# Altium footprint library PcbLibLafe.PcbLib: 297 footprints (part 9 of 19)
Each footprint in its own frame and in the unit in brackets; x right, y up, seen from the top. Pads: shape width x height; smd on the part's side, far side on the other; paste and mask are expansions set on the pad; w line width, h text height; cw(c..) or ccw(c..) is an arc to the next point about the centre after c.
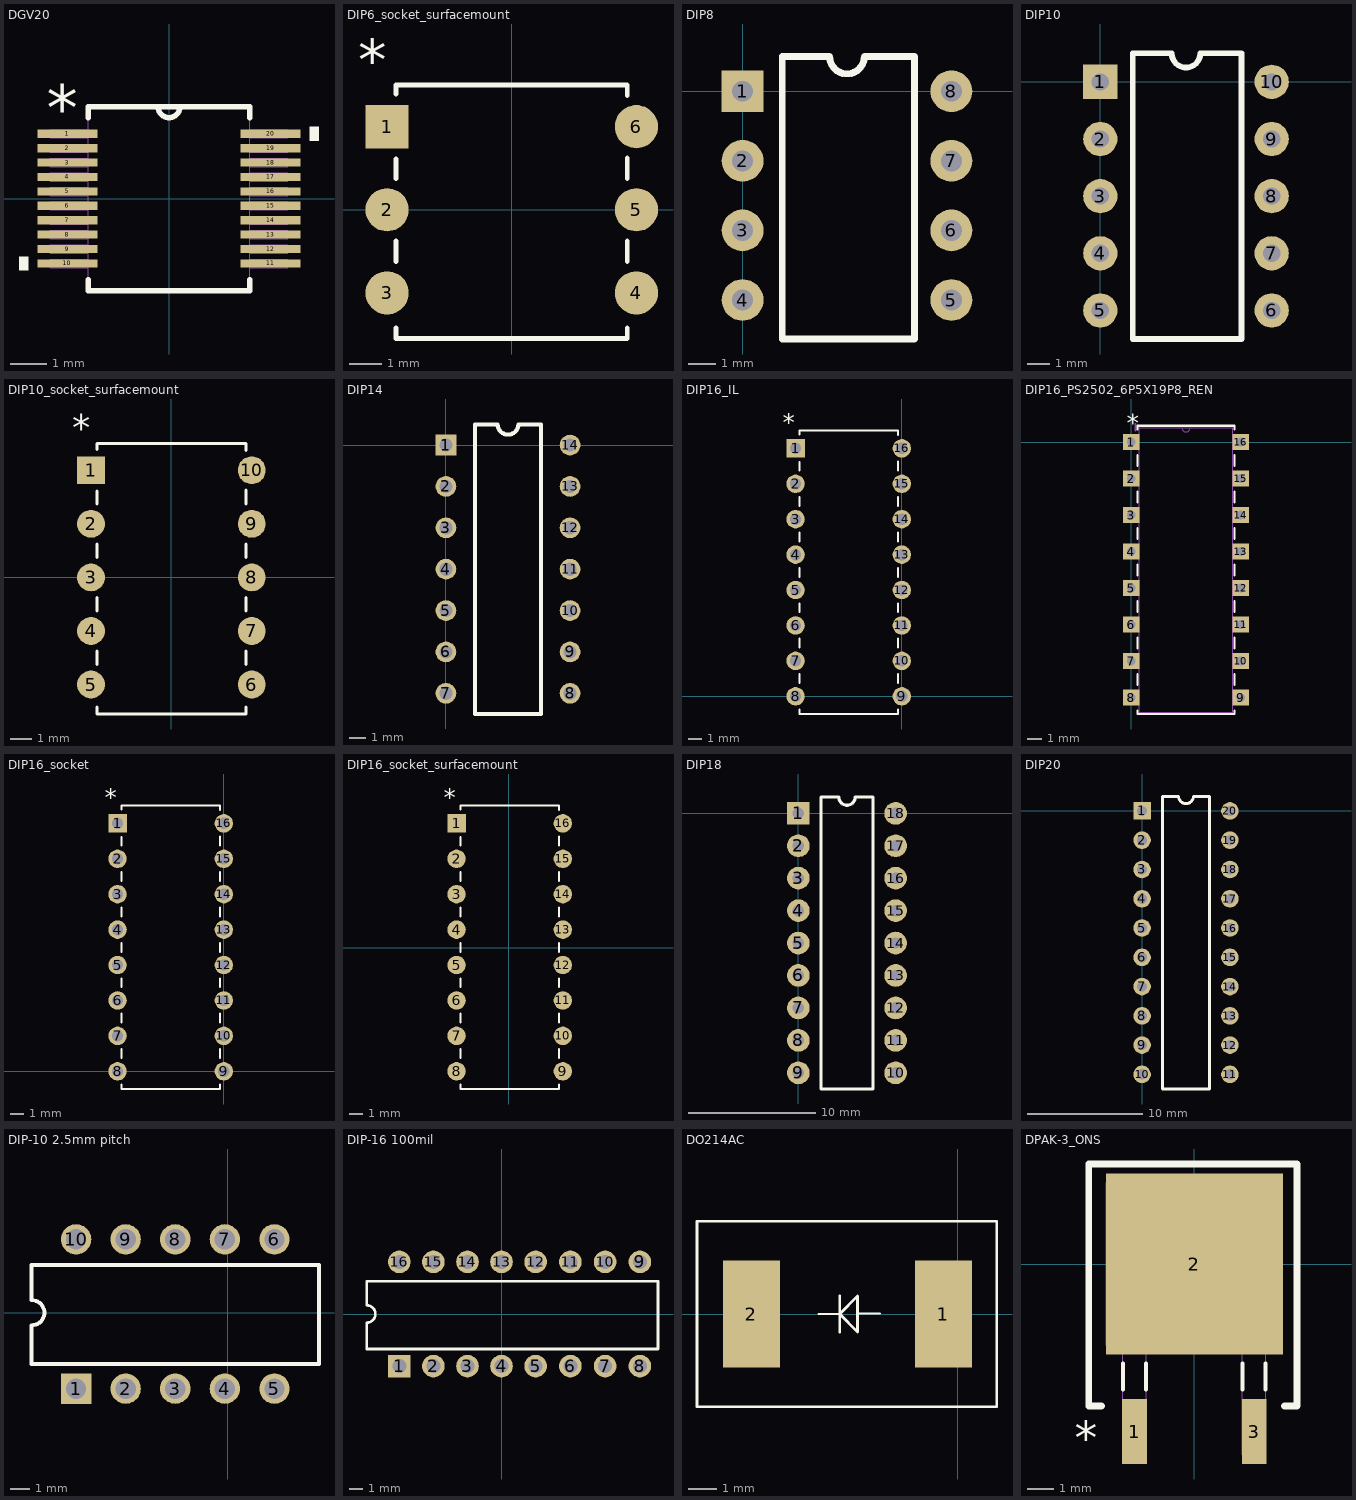
[diagram p8: the footprints below, top view; thin cyan lines are the x and y axes]

## DGV20 [mil]
pads (20):
  rect 66x9 smd: 1(-111,70.87) 2(-111,55.12) 3(-111,39.37) 4(-111,23.62) 5(-111,7.87) 6(-111,-7.87) 7(-111,-23.62) 8(-111,-39.37) 9(-111,-55.12) 10(-111,-70.87) 11(111,-70.87) 12(111,-55.12) 13(111,-39.37) 14(111,-23.62) 15(111,-7.87) 16(111,7.87) 17(111,23.62) 18(111,39.37) 19(111,55.12) 20(111,70.87)
Top Overlay:
  region: -154,-63.37 -164,-63.37 -164,-78.37 -154,-78.37
  region: 154,78.37 164,78.37 164,63.37 154,63.37
  lines w6: -88.5,-88.47 -88.5,-100.5 88.5,-100.5 88.5,-88.47 ; -88.5,88.47 -88.5,100.5 88.5,100.5 88.5,88.47 ; -12,100.5 ccw(c0,100.5) 12,100.5
  text "*" at -133.5,74.87 h50
Mechanical 13:
  lines w0: -12,100.5 ccw(c0,100.5) 12,100.5
  lines w1: -130,-75.37 -130,-66.37 -88.5,-66.37 -88.5,-75.37 -130,-75.37 ; -130,-59.62 -130,-50.62 -88.5,-50.62 -88.5,-59.62 -130,-59.62 ; -130,-43.87 -130,-34.87 -88.5,-34.87 -88.5,-43.87 -130,-43.87 ; -130,-28.12 -130,-19.12 -88.5,-19.12 -88.5,-28.12 -130,-28.12 ; -130,-12.37 -130,-3.37 -88.5,-3.37 -88.5,-12.37 -130,-12.37 ; -130,3.37 -130,12.37 -88.5,12.37 -88.5,3.37 -130,3.37 ; -130,19.12 -130,28.12 -88.5,28.12 -88.5,19.12 -130,19.12 ; -130,34.87 -130,43.87 -88.5,43.87 -88.5,34.87 -130,34.87 ; -130,50.62 -130,59.62 -88.5,59.62 -88.5,50.62 -130,50.62 ; -130,66.37 -130,75.37 -88.5,75.37 -88.5,66.37 -130,66.37 ; -88.5,-100.5 88.5,-100.5 88.5,100.5 -88.5,100.5 -88.5,-100.5 ; 88.5,-75.37 88.5,-66.37 130,-66.37 130,-75.37 88.5,-75.37 ; 88.5,-59.62 88.5,-50.62 130,-50.62 130,-59.62 88.5,-59.62 ; 88.5,-43.87 88.5,-34.87 130,-34.87 130,-43.87 88.5,-43.87 ; 88.5,-28.12 88.5,-19.12 130,-19.12 130,-28.12 88.5,-28.12 ; 88.5,-12.37 88.5,-3.37 130,-3.37 130,-12.37 88.5,-12.37 ; 88.5,3.37 88.5,12.37 130,12.37 130,3.37 88.5,3.37 ; 88.5,19.12 88.5,28.12 130,28.12 130,19.12 88.5,19.12 ; 88.5,34.87 88.5,43.87 130,43.87 130,34.87 88.5,34.87 ; 88.5,50.62 88.5,59.62 130,59.62 130,50.62 88.5,50.62 ; 88.5,66.37 88.5,75.37 130,75.37 130,66.37 88.5,66.37
  text "*" at -133.5,74.87 h50
3D body: height 10, standoff 0, extent 0,0 10,10
3D body "DGV0020A.stp": height 44.49, standoff 0, extent -125.98,-98.42 125.99,98.43

## DIP6_socket_surfacemount [mil]
pads (6):
  rect 52x52 smd mask+10: 1(-150,100)
  round 52 smd mask+10: 2(-150,0) 3(-150,-100) 4(150,-100) 5(150,0) 6(150,100)
Top Overlay:
  lines w6: -139,-142.52 -139,-155 139,-155 139,-142.52 ; -139,-62.48 -139,-37.52 ; -139,37.52 -139,60.9 ; -139,139.1 -139,150 139,150 139,137.52 ; 139,-62.48 139,-37.52 ; 139,37.52 139,62.48
  text "*" at -185,155 h50
Mechanical 13:
  lines w1: -166,-116 -134,-116 -134,-84 -166,-84 -166,-116 ; -166,-16 -134,-16 -134,16 -166,16 -166,-16 ; -166,84 -134,84 -134,116 -166,116 -166,84 ; 134,-116 166,-116 166,-84 134,-84 134,-116 ; 134,-16 166,-16 166,16 134,16 134,-16 ; 134,84 166,84 166,116 134,116 134,84

## DIP8 [mil]
pads (8):
  rect 60x60 hole 30: 1(0,0)
  round 60 hole 30: 2(0,-100) 3(0,-200) 4(0,-300) 5(300,-300) 6(300,-200) 7(300,-100) 8(300,0)
Top Overlay:
  lines w10: 57,-356 247,-356 247,50 175,50 cw(c150,50) 125,50 57,50 57,-356
3D body "210-xx-308-41-001000.SLDPRT": height 109.84, standoff -180.31, extent -48.82,-347.64 348.82,50

## DIP10 [mil]
pads (10):
  rect 60x60 hole 30: 1(0,0)
  round 60 hole 30: 2(0,-100) 3(0,-200) 4(0,-300) 5(0,-400) 6(300,-400) 7(300,-300) 8(300,-200) 9(300,-100) 10(300,0)
Top Overlay:
  lines w10: 57,-450 247,-450 247,50 175,50 cw(c150,50) 125,50 57,50 57,-450

## DIP10_socket_surfacemount [mil]
pads (10):
  rect 52x52 smd mask+10: 1(-150,200)
  round 52 smd mask+10: 2(-150,100) 3(-150,0) 4(-150,-100) 5(-150,-200) 6(150,-200) 7(150,-100) 8(150,0) 9(150,100) 10(150,200)
Top Overlay:
  lines w6: -139,-242.52 -139,-255 139,-255 139,-242.52 ; -139,-162.48 -139,-137.52 ; -139,-62.48 -139,-37.52 ; -139,37.52 -139,62.48 ; -139,137.52 -139,160.9 ; -139,239.1 -139,250 139,250 139,237.52 ; 139,-162.48 139,-137.52 ; 139,-62.48 139,-37.52 ; 139,37.52 139,62.48 ; 139,137.52 139,162.48
  text "*" at -185,255 h50
Mechanical 13:
  lines w1: -166,-216 -134,-216 -134,-184 -166,-184 -166,-216 ; -166,-116 -134,-116 -134,-84 -166,-84 -166,-116 ; -166,-16 -134,-16 -134,16 -166,16 -166,-16 ; -166,84 -134,84 -134,116 -166,116 -166,84 ; -166,184 -134,184 -134,216 -166,216 -166,184 ; 134,-216 166,-216 166,-184 134,-184 134,-216 ; 134,-116 166,-116 166,-84 134,-84 134,-116 ; 134,-16 166,-16 166,16 134,16 134,-16 ; 134,84 166,84 166,116 134,116 134,84 ; 134,184 166,184 166,216 134,216 134,184

## DIP14 [mil]
pads (14):
  rect 50x50 hole 32: 1(0,0)
  round 50 hole 32: 2(0,-100) 3(0,-200) 4(0,-300) 5(0,-400) 6(0,-500) 7(0,-600) 8(300,-600) 9(300,-500) 10(300,-400) 11(300,-300) 12(300,-200) 13(300,-100) 14(300,0)
Top Overlay:
  lines w10: 70,-650 230,-650 230,50 175,50 cw(c150,50) 125,50 70,50 70,-650
3D body "4114r.stp": height 172.44, standoff -142.52, extent -20.47,-686.02 319.69,78.94

## DIP16_IL [mil]
pads (16):
  rect 52x52 hole 32: 1(-300,700)
  round 52 hole 32: 2(-300,600) 3(-300,500) 4(-300,400) 5(-300,300) 6(-300,200) 7(-300,100) 8(-300,0) 9(0,0) 10(0,100) 11(0,200) 12(0,300) 13(0,400) 14(0,500) 15(0,600) 16(0,700)
Top Overlay:
  lines w6: -289,-37.52 -289,-50 -11,-50 -11,-37.52 ; -289,37.52 -289,62.48 ; -289,137.52 -289,162.48 ; -289,237.52 -289,262.48 ; -289,337.52 -289,362.48 ; -289,437.52 -289,462.48 ; -289,537.52 -289,562.48 ; -289,637.52 -289,660.9 ; -289,739.1 -289,750 -11,750 -11,737.52 ; -11,37.52 -11,62.48 ; -11,137.52 -11,162.48 ; -11,237.52 -11,262.48 ; -11,337.52 -11,362.48 ; -11,437.52 -11,462.48 ; -11,537.52 -11,562.48 ; -11,637.52 -11,662.48
  text "*" at -335.63,747.05 h50
Mechanical 13:
  lines w1: -316,-16 -284,-16 -284,16 -316,16 -316,-16 ; -316,84 -284,84 -284,116 -316,116 -316,84 ; -316,184 -284,184 -284,216 -316,216 -316,184 ; -316,284 -284,284 -284,316 -316,316 -316,284 ; -316,384 -284,384 -284,416 -316,416 -316,384 ; -316,484 -284,484 -284,516 -316,516 -316,484 ; -316,584 -284,584 -284,616 -316,616 -316,584 ; -316,684 -284,684 -284,716 -316,716 -316,684 ; -16,-16 16,-16 16,16 -16,16 -16,-16 ; -16,84 16,84 16,116 -16,116 -16,84 ; -16,184 16,184 16,216 -16,216 -16,184 ; -16,284 16,284 16,316 -16,316 -16,284 ; -16,384 16,384 16,416 -16,416 -16,384 ; -16,484 16,484 16,516 -16,516 -16,484 ; -16,584 16,584 16,616 -16,616 -16,584 ; -16,684 16,684 16,716 -16,716 -16,684
3D body "DIP16_IL.step": height 190.12, standoff -100, extent -306.65,-42.95 13.34,747.05
3D body: height 10, standoff 0, extent 0,0 10,10

## DIP16_PS2502_6P5X19P8_REN [mil]
pads (16):
  rect 44x44 hole 24 mask+0: 1(0,0) 2(0,-100) 3(0,-200) 4(0,-300) 5(0,-400) 6(0,-500) 7(0,-600) 8(0,-700) 9(300,-700) 10(300,-600) 11(300,-500) 12(300,-400) 13(300,-300) 14(300,-200) 15(300,-100) 16(300,0)
Top Overlay:
  lines w6: 17,-735.1 17,-745 283,-745 283,-735.1 ; 17,-664.9 17,-635.1 ; 17,-564.9 17,-535.1 ; 17,-464.9 17,-435.1 ; 17,-364.9 17,-335.1 ; 17,-264.9 17,-235.1 ; 17,-164.9 17,-135.1 ; 17,-64.9 17,-35.1 ; 17,35.1 17,45 283,45 283,35.1 ; 283,-664.9 283,-635.1 ; 283,-564.9 283,-535.1 ; 283,-464.9 283,-435.1 ; 283,-364.9 283,-335.1 ; 283,-264.9 283,-235.1 ; 283,-164.9 283,-135.1 ; 283,-64.9 283,-35.1
  text "*" at -12.5,27 h50
Mechanical 13:
  lines w0: 138,40 ccw(c150,40) 162,40
  lines w1: -12,-712 -12,-688 22,-688 22,-712 -12,-712 ; -12,-612 -12,-588 22,-588 22,-612 -12,-612 ; -12,-512 -12,-488 22,-488 22,-512 -12,-512 ; -12,-412 -12,-388 22,-388 22,-412 -12,-412 ; -12,-312 -12,-288 22,-288 22,-312 -12,-312 ; -12,-212 -12,-188 22,-188 22,-212 -12,-212 ; -12,-112 -12,-88 22,-88 22,-112 -12,-112 ; -12,-12 -12,12 22,12 22,-12 -12,-12 ; 22,-740 278,-740 278,40 22,40 22,-740 ; 278,-712 278,-688 312,-688 312,-712 278,-712 ; 278,-612 278,-588 312,-588 312,-612 278,-612 ; 278,-512 278,-488 312,-488 312,-512 278,-512 ; 278,-412 278,-388 312,-388 312,-412 278,-412 ; 278,-312 278,-288 312,-288 312,-312 278,-312 ; 278,-212 278,-188 312,-188 312,-212 278,-212 ; 278,-112 278,-88 312,-88 312,-112 278,-112 ; 278,-12 278,12 312,12 312,-12 278,-12
  text "*" at 19.5,-25 h50
Mechanical 15:
  lines w6: 12,32 12,50
3D body "DIP16_PS2502_6P5X19P8_REN.step": height 184.09, standoff -100, extent -16.8,-738.02 303.19,41.98
3D body: height 10, standoff 0, extent 0,0 10,10

## DIP16_socket [mil]
pads (16):
  rect 52x52 hole 32: 1(-300,700)
  round 52 hole 32: 2(-300,600) 3(-300,500) 4(-300,400) 5(-300,300) 6(-300,200) 7(-300,100) 8(-300,0) 9(0,0) 10(0,100) 11(0,200) 12(0,300) 13(0,400) 14(0,500) 15(0,600) 16(0,700)
Top Overlay:
  lines w6: -289,-37.52 -289,-50 -11,-50 -11,-37.52 ; -289,37.52 -289,62.48 ; -289,137.52 -289,162.48 ; -289,237.52 -289,262.48 ; -289,337.52 -289,362.48 ; -289,437.52 -289,462.48 ; -289,537.52 -289,562.48 ; -289,637.52 -289,660.9 ; -289,739.1 -289,750 -11,750 -11,737.52 ; -11,37.52 -11,62.48 ; -11,137.52 -11,162.48 ; -11,237.52 -11,262.48 ; -11,337.52 -11,362.48 ; -11,437.52 -11,462.48 ; -11,537.52 -11,562.48 ; -11,637.52 -11,662.48
  text "*" at -335.63,747.05 h50
Mechanical 13:
  lines w1: -316,-16 -316,16 -284,16 -284,-16 -316,-16 ; -316,84 -316,116 -284,116 -284,84 -316,84 ; -316,184 -316,216 -284,216 -284,184 -316,184 ; -316,284 -316,316 -284,316 -284,284 -316,284 ; -316,384 -316,416 -284,416 -284,384 -316,384 ; -316,484 -316,516 -284,516 -284,484 -316,484 ; -316,584 -316,616 -284,616 -284,584 -316,584 ; -316,684 -316,716 -284,716 -284,684 -316,684 ; -16,-16 -16,16 16,16 16,-16 -16,-16 ; -16,84 -16,116 16,116 16,84 -16,84 ; -16,184 -16,216 16,216 16,184 -16,184 ; -16,284 -16,316 16,316 16,284 -16,284 ; -16,384 -16,416 16,416 16,384 -16,384 ; -16,484 -16,516 16,516 16,484 -16,484 ; -16,584 -16,616 16,616 16,584 -16,584 ; -16,684 -16,716 16,716 16,684 -16,684
3D body: height 10, standoff 0, extent 0,0 10,10
3D body "socket_ar_16-hzl-tt.stp": height 118.15, standoff -174.41, extent -349.99,-50.01 50.01,749.99

## DIP16_socket_surfacemount [mil]
pads (16):
  rect 52x52 smd mask+10: 1(-147,351)
  round 52 smd mask+10: 2(-147,251) 3(-147,151) 4(-147,51) 5(-147,-49) 6(-147,-149) 7(-147,-249) 8(-147,-349) 9(153,-349) 10(153,-249) 11(153,-149) 12(153,-49) 13(153,51) 14(153,151) 15(153,251) 16(153,351)
Top Overlay:
  lines w6: -136,-386.53 -136,-399 142,-399 142,-386.53 ; -136,-311.48 -136,-286.53 ; -136,-211.48 -136,-186.53 ; -136,-111.48 -136,-86.53 ; -136,-11.48 -136,13.47 ; -136,88.52 -136,113.47 ; -136,188.52 -136,213.47 ; -136,288.52 -136,311.9 ; -136,390.1 -136,401 142,401 142,388.52 ; 142,-311.48 142,-286.53 ; 142,-211.48 142,-186.53 ; 142,-111.48 142,-86.53 ; 142,-11.48 142,13.47 ; 142,88.52 142,113.47 ; 142,188.52 142,213.47 ; 142,288.52 142,313.47
  text "*" at -182.63,398.04 h50
Mechanical 13:
  lines w1: -163,-365 -131,-365 -131,-333 -163,-333 -163,-365 ; -163,-265 -131,-265 -131,-233 -163,-233 -163,-265 ; -163,-165 -131,-165 -131,-133 -163,-133 -163,-165 ; -163,-65 -131,-65 -131,-33 -163,-33 -163,-65 ; -163,35 -131,35 -131,67 -163,67 -163,35 ; -163,135 -131,135 -131,167 -163,167 -163,135 ; -163,235 -131,235 -131,267 -163,267 -163,235 ; -163,335 -131,335 -131,367 -163,367 -163,335 ; 137,-365 169,-365 169,-333 137,-333 137,-365 ; 137,-265 169,-265 169,-233 137,-233 137,-265 ; 137,-165 169,-165 169,-133 137,-133 137,-165 ; 137,-65 169,-65 169,-33 137,-33 137,-65 ; 137,35 169,35 169,67 137,67 137,35 ; 137,135 169,135 169,167 137,167 137,135 ; 137,235 169,235 169,267 137,267 137,235 ; 137,335 169,335 169,367 137,367 137,335
3D body: height 10, standoff 0, extent 153,-349 163,-339
3D body "socket_ar_16-hzl-tt.stp": height 120.15, standoff -172.41, extent -200,-400 200,400

## DIP18 [mil]
pads (18):
  rect 70x70 hole 35: 1(0,0)
  round 70 hole 35: 2(0,-100) 3(0,-200) 4(0,-300) 5(0,-400) 6(0,-500) 7(0,-600) 8(0,-700) 9(0,-800) 10(300,-800) 11(300,-700) 12(300,-600) 13(300,-500) 14(300,-400) 15(300,-300) 16(300,-200) 17(300,-100) 18(300,0)
Top Overlay:
  lines w10: 70,-850 70,50 125,50 ccw(c150,50) 175,50 230,50 230,-850 70,-850
3D body "DIP-18_STM.step": height 206.1, standoff -100, extent -5.97,-868.3 314.02,107.69

## DIP20 [mil]
pads (20):
  rect 60x60 hole 35: 1(0,0)
  round 60 hole 35: 2(0,-100) 3(0,-200) 4(0,-300) 5(0,-400) 6(0,-500) 7(0,-600) 8(0,-700) 9(0,-800) 10(0,-900) 11(300,-900) 12(300,-800) 13(300,-700) 14(300,-600) 15(300,-500) 16(300,-400) 17(300,-300) 18(300,-200) 19(300,-100) 20(300,0)
Top Overlay:
  lines w10: 70,-950 230,-950 230,50 175,50 cw(c150,50) 125,50 70,50 70,-950

## DIP-10 2.5mm pitch [mil] "DIP10 2.5mm pitch"
height 200
pads (10):
  rect 60x60 hole 40: 1(-300,-150)
  round 60 hole 40: 2(-202,-150) 3(-104,-150) 4(-6,-150) 5(92,-150) 6(92,145) 7(-6,145) 8(-104,145) 9(-202,145) 10(-300,145)
Top Overlay:
  lines w7.87: -387.8,-101 -387.8,-25 ccw(c-387.8,0) -387.8,25 -387.8,94 180,94 180,-101 -387.8,-101

## DIP-16 100mil [mil] "DIP-19 100 mil x 300wide"
height 200
pads (16):
  rect 65x65 hole 40: 1(-294,-150)
  round 65 hole 40: 2(-196,-150) 3(-98,-150) 4(0,-150) 5(98,-150) 6(198,-150) 7(298,-150) 8(398,-150) 9(398,150) 10(298,150) 11(198,150) 12(98,150) 13(0,150) 14(-98,150) 15(-196,150) 16(-294,150)
Top Overlay:
  lines w7.87: -387.8,-101 450,-101 450,94 -387.8,94 -387.8,25 cw(c-387.8,0) -387.8,-25 -387.8,-101

## DO214AC [mil]
pads (2):
  rect 80x150 smd: 1(-19.68,0) 2(-288.74,0)
Top Overlay:
  lines w3: -195,0 -165,0 ; -139,0.5 -109,0.5
  lines w4: -354.33,129.92 55,129.92 55,-129.92 10,-129.92 ; -320,129.92 -365,129.92 -365,-129.92 48.23,-129.92 ; -165,-25 -165,0 ; -165,25 -165,0 ; -165,0 -140,-25 -140,0 -140,25 -165,0
3D body "User Library-Diode Molded 5025Body.step": height 90.65, standoff 5.61, extent -301.5,-117.1 9.52,119.12

## DPAK-3_ONS [mil]
pads (3):
  rect 37x98 smd paste+0 mask+0: 1(-90.16,-252.5) 3(90.16,-252.5)
  rect 267x273 smd paste+0 mask+0: 2(0,0)
Top Overlay:
  lines w6: -107.66,-189.5 -107.66,-149.6 ; -72.66,-189.5 -72.66,-149.6 ; 72.66,-189.5 72.66,-149.6 ; 107.66,-189.5 107.66,-149.6
  lines w10: -140,-214 -159,-214 -159,151 155,151 155,-214 136,-214
  text "*" at -180,-286 h50
Mechanical 13:
  lines w1: -132.5,-122.5 132.5,-122.5 132.5,122.5 -132.5,122.5 -132.5,-122.5 ; -107.66,-287.5 -107.66,-122.5 -72.66,-122.5 -72.66,-287.5 -107.66,-287.5 ; 72.66,-287.5 72.66,-122.5 107.66,-122.5 107.66,-287.5 72.66,-287.5
  text "*" at -102.66,-137.5 h50
3D body: height 10, standoff 0, extent 0,0 10,10
3D body "DPAK-3_ONS.step": height 67.09, standoff -2.01, extent -132.51,-194.99 132.52,122.6